# Altium footprint library RT1064_V1PCB.PcbLib: 33 footprints (part 1 of 3)
Each footprint in its own frame and in the unit in brackets; x right, y up, seen from the top. Pads: shape width x height; smd on the part's side, far side on the other; paste and mask are expansions set on the pad; w line width, h text height; cw(c..) or ccw(c..) is an arc to the next point about the centre after c.
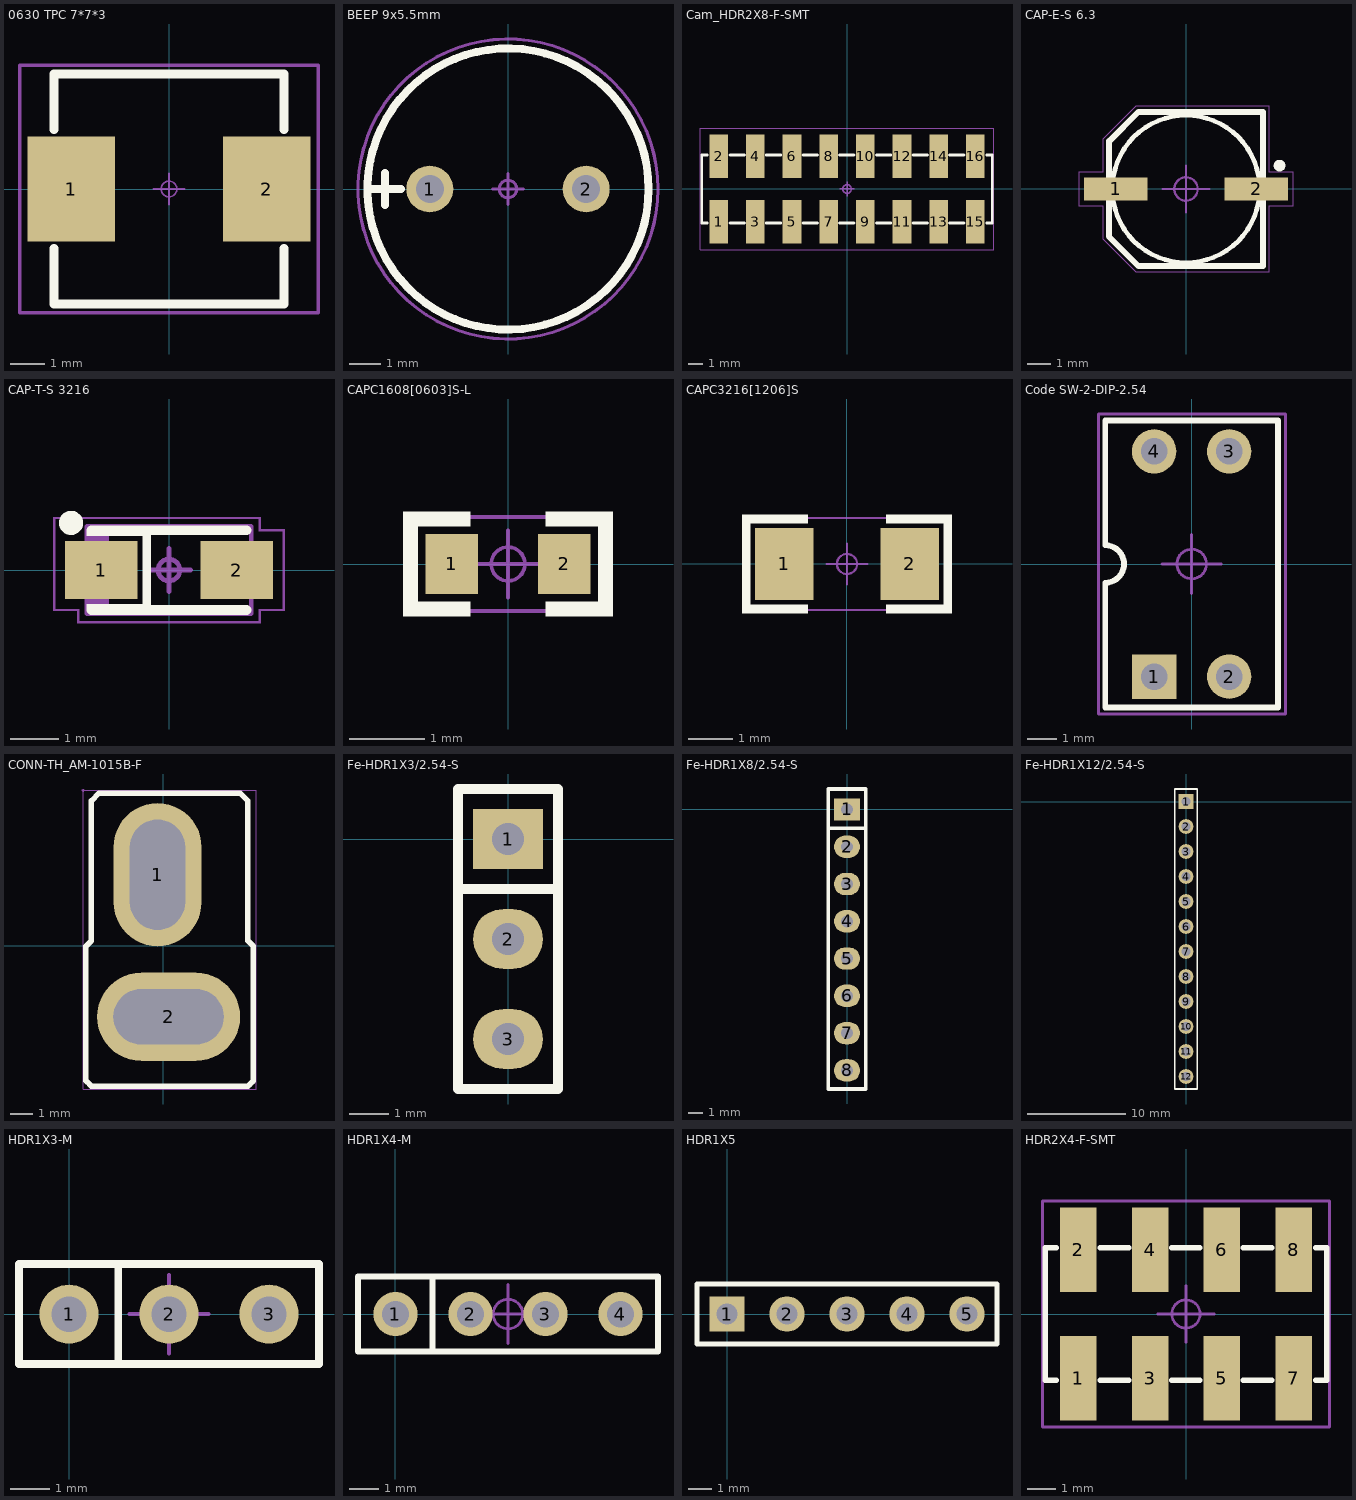
[diagram p0: the footprints below, top view; thin cyan lines are the x and y axes]

## 0630 TPC 7*7*3 [mm]
pads (2):
  rect 2.5x3 smd: 1(-2.8,0) 2(2.8,0)
Top Overlay:
  lines w0.254: -3.3,-1.7 -3.3,-3.3 3.3,-3.3 3.3,-1.7 ; -3.3,1.7 -3.3,3.3 3.3,3.3 3.3,1.7
Top Designator:
  text ".Designator" at -1.904,-0.127 h0.38
Top Component Outline:
  lines w0.1: -4.275,-3.55 -4.275,3.55 4.275,3.55 4.275,-3.55 -4.275,-3.55
Top Component Center:
  circle w0.05: c0,0 r0.225
  lines w0.05: -0.45,0 0.45,0 ; 0,-0.45 0,0.45
3D body: height 3, standoff 0, extent -3.3,-3.3 3.3,3.3

## BEEP 9x5.5mm [mm]
pads (2):
  round 1.5 hole 0.9: 1(-2.5,0) 2(2.5,0)
Top Overlay:
  circle w0.254: c0,0 r4.5
  lines w0.254: -4.496,0 -3.429,0 ; -3.937,-0.508 -3.937,0.508
Top Designator:
  text ".Designator" at -1.904,-0.127 h0.38
Top Component Outline:
  circle w0.1: c0,0 r4.8
Top Component Center:
  circle w0.1: c0,0 r0.28
  lines w0.1: -0.5,0 0.5,0 ; 0,-0.5 0,0.5
3D body "cx-0905c.stp": height 5.05, standoff -5.45, extent -4.8,-4.8 4.8,4.8

## Cam_HDR2X8-F-SMT [mm]
pads (16):
  rect 1.3x3 smd: 1(-8.89,-2.27) 2(-8.89,2.27) 3(-6.35,-2.27) 4(-6.35,2.27) 5(-3.81,-2.27) 6(-3.81,2.27) 7(-1.27,-2.27) 8(-1.27,2.27) 9(1.27,-2.27) 10(1.27,2.27) 11(3.81,-2.27) 12(3.81,2.27) 13(6.35,-2.27) 14(6.35,2.27) 15(8.89,-2.27) 16(8.89,2.27)
Top Overlay:
  lines w0.2: -9.677,-2.35 -10.058,-2.35 -10.058,2.35 -9.677,2.35 ; -8.11,-2.35 -7.11,-2.35 ; -8.11,2.35 -7.11,2.35 ; -5.59,-2.35 -4.59,-2.35 ; -5.59,2.35 -4.59,2.35 ; -3.05,-2.35 -2.05,-2.35 ; -3.05,2.35 -2.05,2.35 ; -0.51,-2.35 0.49,-2.35 ; -0.51,2.35 0.49,2.35 ; 2.03,-2.35 3.03,-2.35 ; 2.03,2.35 3.03,2.35 ; 4.57,-2.35 5.57,-2.35 ; 4.57,2.35 5.57,2.35 ; 7.11,-2.35 8.11,-2.35 ; 7.11,2.35 8.11,2.35 ; 9.677,-2.35 10.058,-2.35 10.058,2.35 9.677,2.35
Top Designator:
  text ".Designator" at -1.904,-0.127 h0.38
Top Component Outline:
  lines w0.05: -10.16,-4.2 -10.16,4.2 10.16,4.2 10.16,-4.2 -10.16,-4.2
Top Component Center:
  circle w0.1: c0,0 r0.3
  lines w0.1: -0.5,0 0.5,0 ; 0,-0.5 0,0.5
3D body "61001621821-无盖.STEP": height 7.47, standoff -0.03, extent -10.16,-3.35 10.16,3.35
3D body "摄像头转接板 V3.0.step": height 14.2, standoff 1.85, extent -10.8,-5 10.8,5

## CAP-E-S 6.3 [mm]
pads (2):
  rect 2.7x1 smd: 1(-3,0) 2(3,0)
Top Overlay:
  circle w0.2: c0,0 r3.15
  circle w0.25: c4,1 r0.125
  lines w0.254: -3.3,2.032 -3.3,-2.032 -2.032,-3.3 3.3,-3.3 3.3,3.3 -2.032,3.3 -3.287,2.045
Top Designator:
  text ".Designator" at -1.904,-0.127 h0.38
Top Component Outline:
  region: 3.575,-0.7 3.525,-0.7 3.525,-3.575 3.575,-3.575
  region: 4.6,-0.75 4.6,-0.7 3.525,-0.7 3.525,-0.75
  region: 4.6,0.75 4.55,0.75 4.55,-0.75 4.6,-0.75
  region: 3.525,0.75 3.525,0.7 4.6,0.7 4.6,0.75
  region: 3.575,3.575 3.525,3.575 3.525,0.7 3.575,0.7
  region: -3.54,-2.115 -3.575,-2.15 -2.15,-3.575 -2.115,-3.54
  region: -2.15,-3.525 -2.15,-3.575 3.575,-3.575 3.575,-3.525
  region: -2.115,3.54 -2.15,3.575 -3.575,2.15 -3.54,2.115
  region: 3.575,3.525 3.575,3.575 -2.15,3.575 -2.15,3.525
  rectangle: -3.575,-2.15 -3.525,-0.7
  region: -3.525,-0.75 -3.525,-0.7 -4.6,-0.7 -4.6,-0.75
  rectangle: -4.6,-0.75 -4.55,0.75
  region: -3.525,2.15 -3.575,2.15 -3.575,0.7 -3.525,0.7
  region: -3.525,0.7 -3.525,0.75 -4.6,0.75 -4.6,0.7
Top Component Center:
  circle w0.1: c0,0 r0.5
  lines w0.1: -1,0 1,0 ; 0,-1 0,1
3D body "SL-E.step": height 5.2, standoff 0, extent -3.5,-3.302 3.5,3.298

## CAP-T-S 3216 [mm]
pads (2):
  rect 1.5x1.2 smd: 1(-1.4,0) 2(1.4,0)
Top Overlay:
  circle w0.25: c-2.025,0.975 r0.125
  rectangle: -0.55,-0.9 -0.375,0.85
  region: -0.375,-0.7 -1.7,-0.7 -1.7,-0.825 -0.375,-0.825
  rectangle: -1.7,0.7 -0.375,0.85
  lines w0.2: -1.6,-0.825 1.6,-0.825 ; -1.6,0.825 1.6,0.825
Top Designator:
  text ".Designator" at -1.904,-0.052 h0.38
Mechanical 13:
  rectangle: -1.7,-0.9 -1.243,0.9
  lines w0.1: -1.7,-0.9 1.7,-0.9 1.7,0.9 -1.7,0.9 -1.7,-0.9
Top Component Outline:
  region: -1.9,-1.05 -1.9,-1.1 1.9,-1.1 1.9,-1.05
  region: 2.4,0.85 2.35,0.85 2.35,-0.85 2.4,-0.85
  region: 1.9,1.05 1.9,1.1 -2.4,1.1 -2.4,1.05
  rectangle: -2.4,-0.85 -2.35,1.1
  region: 1.85,0.85 1.85,0.8 2.4,0.8 2.4,0.85
  rectangle: 1.85,0.8 1.9,1.1
  region: 2.4,-0.85 2.4,-0.8 1.85,-0.8 1.85,-0.85
  rectangle: 1.85,-1.1 1.9,-0.8
  region: -1.85,-0.85 -1.85,-0.8 -2.4,-0.8 -2.4,-0.85
  region: -1.85,-0.8 -1.9,-0.8 -1.9,-1.1 -1.85,-1.1
Top Component Center:
  circle w0.1: c0,0 r0.225
  lines w0.1: -0.45,0 0.45,0 ; 0,-0.45 0,0.45
3D body "TAJ-A.STEP": height 1.6, standoff 0, extent -1.6,-0.8 1.6,0.8

## CAPC1608[0603]S-L [mm]
pads (2):
  rect 0.7x0.8 smd: 1(-0.75,0) 2(0.75,0)
Top Overlay:
  region: 1.4,0.7 0.5,0.7 0.5,0.5 1.4,0.5
  region: 1.4,-0.7 1.4,0.7 1.2,0.7 1.2,-0.7
  region: 1.4,-0.5 0.5,-0.5 0.5,-0.7 1.4,-0.7
  rectangle: -1.4,-0.7 -0.5,-0.5
  region: -1.4,0.7 -1.4,-0.7 -1.2,-0.7 -1.2,0.7
  rectangle: -1.4,0.5 -0.5,0.7
Top Designator:
  text ".Designator" at -1.904,-0.127 h0.38
Top Component Outline:
  region: -1.35,-0.6 -1.35,-0.65 1.35,-0.65 1.35,-0.6
  region: 1.35,0.65 1.3,0.65 1.3,-0.65 1.35,-0.65
  region: 1.35,0.6 1.35,0.65 -1.35,0.65 -1.35,0.6
  rectangle: -1.35,-0.65 -1.3,0.65
Top Component Center:
  circle w0.05: c0,0 r0.225
  lines w0.05: -0.45,0 0.45,0 ; 0,-0.45 0,0.45
3D body: height 0.79, standoff 0, extent -0.45,-0.406 0.45,0.406
3D body: height 0.79, standoff 0, extent 0.45,-0.406 0.8,0.407
3D body: height 0.79, standoff 0, extent -0.8,-0.406 -0.45,0.406

## CAPC3216[1206]S [mm]
pads (2):
  rect 1.3x1.6 smd: 1(-1.4,0) 2(1.4,0)
Top Overlay:
  region: -2.35,1.1 -2.35,-1.1 -2.15,-1.1 -2.15,1.1
  region: 2.35,-1.1 2.35,1.1 2.15,1.1 2.15,-1.1
  rectangle: -2.35,0.9 -0.875,1.1
  region: 2.346,1.106 0.871,1.106 0.871,0.906 2.346,0.906
  rectangle: -2.35,-1.1 -0.875,-0.9
  region: 2.346,-0.906 0.871,-0.906 0.871,-1.106 2.346,-1.106
Top Designator:
  text ".Designator" at -1.904,-0.127 h0.38
Top Component Outline:
  region: -2.3,-1 -2.3,-1.05 2.3,-1.05 2.3,-1
  region: 2.3,1.05 2.25,1.05 2.25,-1.05 2.3,-1.05
  region: 2.3,1 2.3,1.05 -2.3,1.05 -2.3,1
  rectangle: -2.3,-1.05 -2.25,1.05
Top Component Center:
  circle w0.05: c0,0 r0.225
  lines w0.05: -0.45,0 0.45,0 ; 0,-0.45 0,0.45
3D body "C 1206.STEP": height 1.21, standoff -0.01, extent -1.6,-0.81 1.6,0.81

## Code SW-2-DIP-2.54 [mm]
pads (4):
  rect 1.5x1.5 hole 0.9: 1(-1.27,-3.81)
  round 1.5 hole 0.9: 2(1.27,-3.81) 3(1.27,3.81) 4(-1.27,3.81)
Top Overlay:
  lines w0.2: -2.925,-4.85 2.925,-4.85 2.925,4.85 -2.925,4.85 -2.925,0.635 cw(c-2.925,0) -2.925,-0.635 -2.925,-4.85
Top Designator:
  text ".Designator" at -1.904,-0.127 h0.38
Top Component Outline:
  lines w0.1: -3.15,-5.075 -3.15,5.075 3.175,5.075 3.175,-5.075 -3.15,-5.075
Top Component Center:
  circle w0.1: c0,0 r0.5
  lines w0.1: -1,0 1,0 ; 0,-1 0,1
3D body "Switch-DIP-2.STEP": height 7.03, standoff -3.67, extent -3.04,-4.95 3.04,4.95

## CONN-TH_AM-1015B-F [mm]
pads (2):
  oval 4x6.5 hole 2.5 slot 5 at 90 deg copper offset 0.001,-0.001: 1(-0.251,3.225)
  oval 6.5x4 hole 2.5 slot 5 at 0 deg: 2(0.25,-3.225)
Top Overlay:
  lines w0.254: 3.4,6.926 -2.9,6.926 -3.25,6.576 -3.25,0.276 -3.25,0.225 -3.499,-0.024 -3.499,-6.125 -3.324,-6.3 -3.25,-6.374 3.8,-6.374 ; 3.5,6.926 3.85,6.576 3.85,0.276 3.85,0.225 4.099,-0.024 4.099,-6.125 3.924,-6.3 3.85,-6.374
Bottom Component Outline:
  region: -3.566,7.053 -3.566,7.077 -3.601,7.113 -3.651,7.113 -3.686,7.077 -3.686,7.053 -3.686,7.028 -3.651,6.993 -3.601,6.993 -3.566,7.028 -3.566,7.053
  region: 1.5,-4.225 -1,-4.225 -1,-2.225 1.5,-2.225
  region: -1.25,1.974 -1.25,4.474 0.75,4.474 0.75,1.974
  lines w0.051: -3.626,-6.501 -3.626,7.053 4.226,7.053 4.226,-6.501 -3.626,-6.501

## Fe-HDR1X3/2.54-S [mil]
pads (3):
  rect 70x60 hole 32: 1(0,0)
  oval 70x60 hole 32: 2(0,-100) 3(0,-200)
Top Overlay:
  lines w10: -50,-50 50,-50 ; -50,-250 -50,50 50,50 50,-250 -50,-250
3D body "Female-Header-2.54-Single-3.stp": height 334.65, standoff -125.98, extent -50,-254.92 48.43,54.92

## Fe-HDR1X8/2.54-S [mil]
pads (8):
  rect 70x60 hole 32: 1(0,0)
  oval 70x60 hole 32: 2(0,-100) 3(0,-200) 4(0,-300) 5(0,-400) 6(0,-500) 7(0,-600) 8(0,-700)
Top Overlay:
  lines w10: -50,-50 50,-50 ; -50,-750 -50,55 50,55 50,-750 -50,-750
3D body "Female-Header-2.54-Single-8.stp": height 125.98, standoff -334.65, extent -49.21,-754.92 49.22,54.92

## Fe-HDR1X12/2.54-S [mm]
pads (12):
  rect 1.5x1.5 hole 0.9: 1(0,0)
  round 1.5 hole 0.9: 2(0,-2.54) 3(0,-5.08) 4(0,-7.62) 5(0,-10.16) 6(0,-12.7) 7(0,-15.24) 8(0,-17.78) 9(0,-20.32) 10(0,-22.86) 11(0,-25.4) 12(0,-27.94)
Top Overlay:
  lines w0.2: -1.143,-29.21 1.143,-29.21 1.143,-0.508 1.143,1.27 -1.143,1.27 -1.143,-29.21
3D body "Female-Header-2.54-Single-12.stp": height 3.2, standoff -8.5, extent -1.27,-29.337 1.23,1.393

## HDR1X3-M [mm]
pads (3):
  round 1.5 hole 0.9: 1(0,0) 2(2.54,0) 3(5.08,0)
Top Overlay:
  lines w0.2: 1.25,-1.25 1.25,1.25 ; -1.27,-1.27 6.35,-1.27 6.35,1.27 -1.27,1.27 -1.27,-1.27
Top Designator:
  text ".Designator" at 0.636,-0.127 h0.38
Top Component Outline:
  lines w0.1: -1.27,-1.27 6.35,-1.27 6.35,1.275 -1.27,1.275 -1.27,-1.27
Top Component Center:
  circle w0.1: c2.54,0 r0.5
  lines w0.1: 1.54,0 3.54,0 ; 2.54,-1 2.54,1
3D body "1001-3.STEP": height 8.54, standoff -3, extent -1.27,-1.27 6.35,1.27

## HDR1X4-M [mm]
pads (4):
  round 1.5 hole 0.9: 1(0,0) 2(2.54,0) 3(5.08,0) 4(7.62,0)
Top Overlay:
  lines w0.2: 1.25,-1.25 1.25,1.25 ; -1.27,-1.27 -1.27,1.27 8.89,1.27 8.89,-1.27 -1.27,-1.27
Top Designator:
  text ".Designator" at 1.906,-0.127 h0.38
Top Component Outline:
  lines w0.1: -1.27,-1.27 8.89,-1.27 8.89,1.275 -1.27,1.275 -1.27,-1.27
Top Component Center:
  circle w0.1: c3.81,0 r0.5
  lines w0.1: 2.81,0 4.81,0 ; 3.81,-1 3.81,1
3D body "1001-4.STEP": height 8.54, standoff -3, extent -1.27,-1.27 8.89,1.27

## HDR1X5 [mm]
pads (5):
  rect 1.5x1.5 hole 0.9: 1(0,0)
  round 1.5 hole 0.9: 2(2.54,0) 3(5.08,0) 4(7.62,0) 5(10.16,0)
Top Overlay:
  lines w0.2: -1.27,-1.27 -1.27,1.27 11.43,1.27 11.43,-1.27 -1.27,-1.27

## HDR2X4-F-SMT [mm]
pads (8):
  rect 1.3x3 smd: 1(-3.81,-2.27) 2(-3.81,2.27) 3(-1.27,-2.27) 4(-1.27,2.27) 5(1.27,-2.27) 6(1.27,2.27) 7(3.81,-2.27) 8(3.81,2.27)
Top Overlay:
  lines w0.2: -4.597,-2.35 -4.978,-2.35 -4.978,2.35 -4.597,2.35 ; -3.03,-2.35 -2.03,-2.35 ; -3.03,2.35 -2.03,2.35 ; -0.51,-2.35 0.49,-2.35 ; -0.51,2.35 0.49,2.35 ; 2.03,-2.35 3.03,-2.35 ; 2.03,2.35 3.03,2.35 ; 4.597,-2.35 4.978,-2.35 4.978,2.35 4.597,2.35
Top Designator:
  text ".Designator" at -1.904,-0.252 h0.38
Top Component Outline:
  lines w0.1: -5.08,-4 3.825,-4 5.08,-4 5.08,4 -5.08,4 -5.08,-4
Top Component Center:
  circle w0.1: c0,0 r0.5
  lines w0.1: -1,0 1,0 ; 0,-1 0,1
3D body "61000821821-无盖.STEP": height 7.47, standoff -0.03, extent -5.08,-3.35 5.08,3.35